# Altium footprint library LUMI_Standard_Auto_Soldering_LIB.PcbLib: 344 footprints (part 9 of 22)
Each footprint in its own frame and in the unit in brackets; x right, y up, seen from the top. Pads: shape width x height; smd on the part's side, far side on the other; paste and mask are expansions set on the pad; w line width, h text height; cw(c..) or ccw(c..) is an arc to the next point about the centre after c.
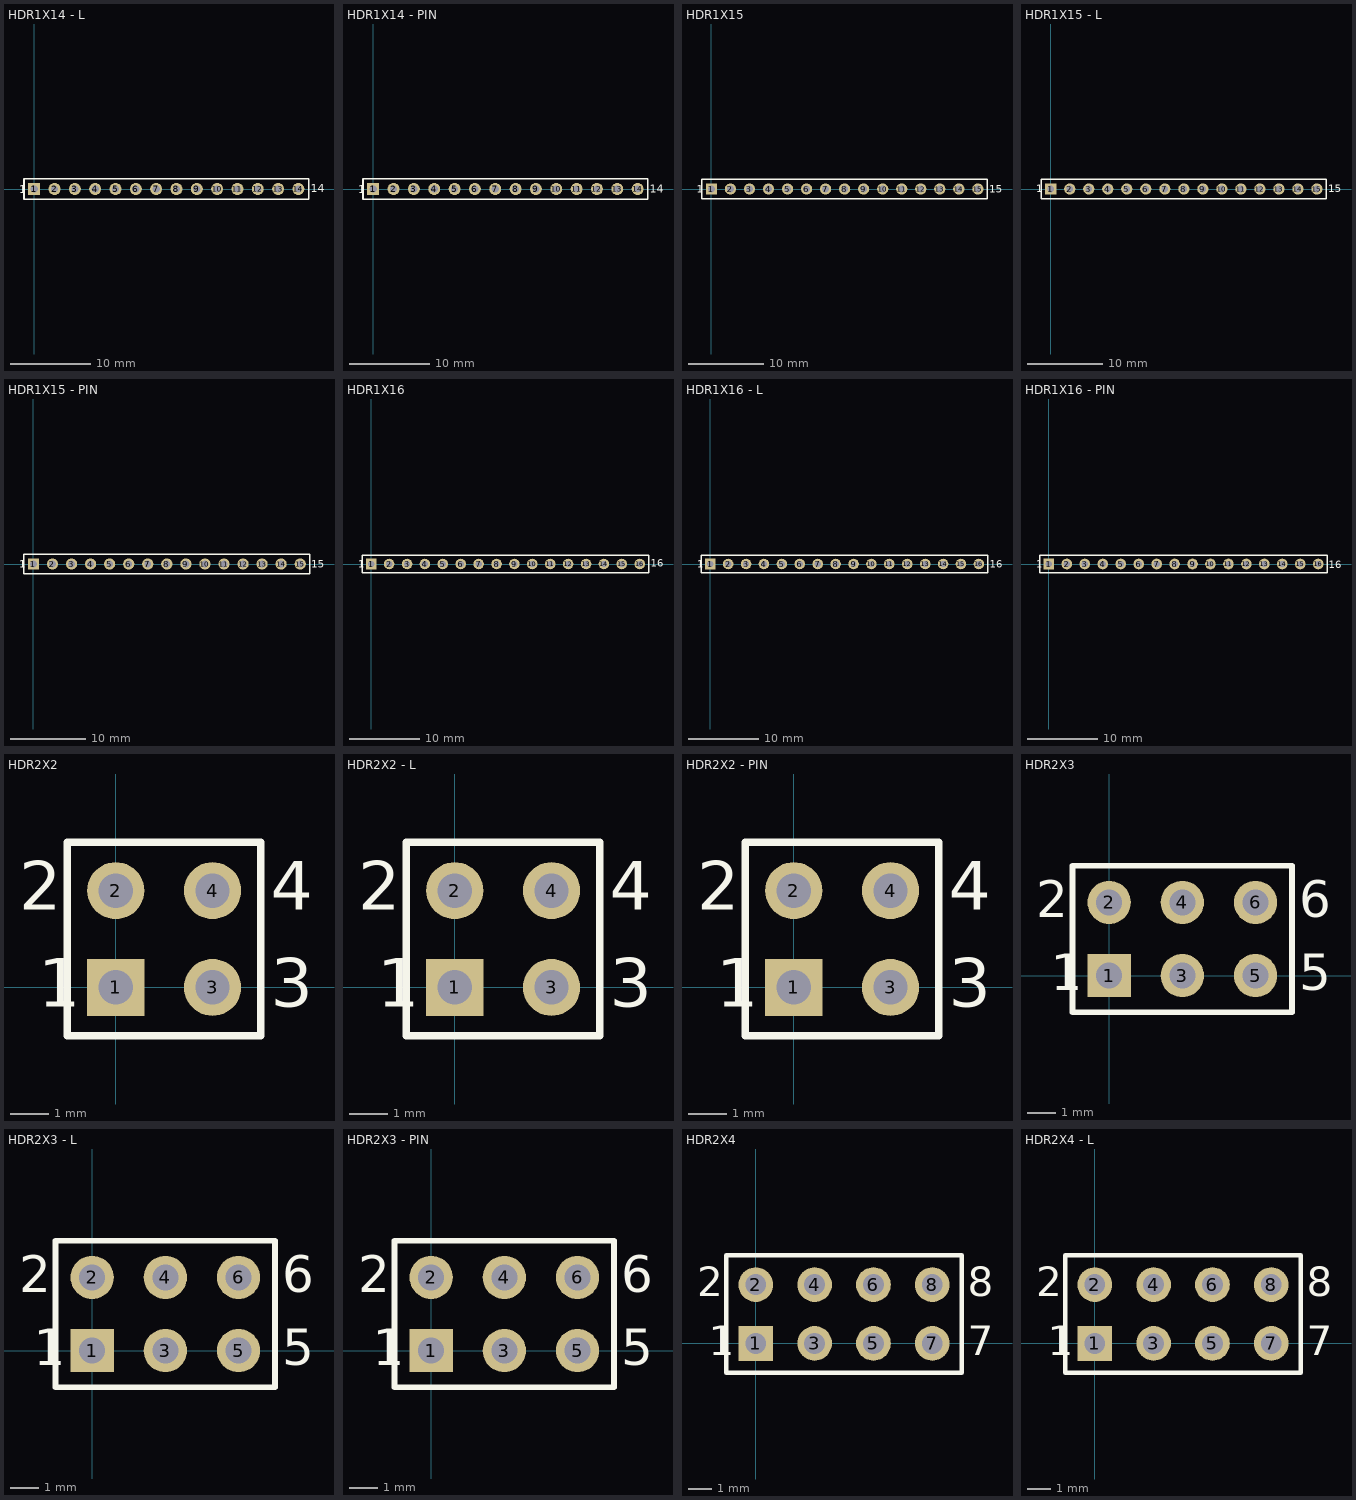
[diagram p8: the footprints below, top view; thin cyan lines are the x and y axes]

## HDR1X14 - L [mm] "Connector; Header; 14 Position"
pads (14):
  rect 1.5x1.5 hole 0.9: 1(0,0)
  round 1.5 hole 0.9: 2(2.54,0) 3(5.08,0) 4(7.62,0) 5(10.16,0) 6(12.7,0) 7(15.24,0) 8(17.78,0) 9(20.32,0) 10(22.86,0) 11(25.4,0) 12(27.94,0) 13(30.48,0) 14(33.02,0)
Top Overlay:
  lines w0.2: -1.27,-1.27 -1.27,1.27 0.635,1.27 34.29,1.27 34.29,-1.27 -1.27,-1.27
  text "14" at 34.575,-0.425 h1.02
  text "1" at -1.9,-0.525 h1.02
3D body: height 4.33, standoff -3, extent 16.586,-1.27 34.366,7
3D body: height 4.33, standoff -3, extent -1.219,-1.27 16.561,7

## HDR1X14 - PIN [mm] "Connector; Header; 14 Position"
pads (14):
  rect 1.5x1.5 hole 0.9: 1(0,0)
  round 1.5 hole 0.9: 2(2.54,0) 3(5.08,0) 4(7.62,0) 5(10.16,0) 6(12.7,0) 7(15.24,0) 8(17.78,0) 9(20.32,0) 10(22.86,0) 11(25.4,0) 12(27.94,0) 13(30.48,0) 14(33.02,0)
Top Overlay:
  lines w0.2: -1.27,-1.27 -1.27,1.27 0.635,1.27 34.29,1.27 34.29,-1.27 -1.27,-1.27
  text "1" at -1.9,-0.5 h1.02
  text "14" at 34.55,-0.45 h1.02
3D body: height 6.02, standoff -3.1, extent -1.27,-1.295 6.35,1.245
3D body: height 6.02, standoff -3.1, extent 6.35,-1.295 13.97,1.245
3D body: height 6.02, standoff -3.1, extent 13.97,-1.295 24.13,1.245
3D body: height 6.02, standoff -3.1, extent 24.13,-1.295 34.29,1.245

## HDR1X15 [mm] "Connector; Header; 15 Position"
pads (15):
  rect 1.5x1.5 hole 0.9: 1(0,0)
  round 1.5 hole 0.9: 2(2.54,0) 3(5.08,0) 4(7.62,0) 5(10.16,0) 6(12.7,0) 7(15.24,0) 8(17.78,0) 9(20.32,0) 10(22.86,0) 11(25.4,0) 12(27.94,0) 13(30.48,0) 14(33.02,0) 15(35.56,0)
Top Overlay:
  lines w0.2: -1.27,-1.27 -1.27,1.27 0.635,1.27 36.83,1.27 36.83,-1.27 -1.27,-1.27
  text "15" at 37.1,-0.475 h1.02
  text "1" at -1.925,-0.525 h1.02
3D body: height 8.52, standoff -2.48, extent -1.27,-1.25 11.43,1.25
3D body: height 8.52, standoff -2.48, extent 11.43,-1.25 24.13,1.25
3D body: height 8.52, standoff -2.48, extent 24.13,-1.25 36.83,1.25

## HDR1X15 - L [mm] "Connector; Header; 15 Position"
pads (15):
  rect 1.5x1.5 hole 0.9: 1(0,0)
  round 1.5 hole 0.9: 2(2.54,0) 3(5.08,0) 4(7.62,0) 5(10.16,0) 6(12.7,0) 7(15.24,0) 8(17.78,0) 9(20.32,0) 10(22.86,0) 11(25.4,0) 12(27.94,0) 13(30.48,0) 14(33.02,0) 15(35.56,0)
Top Overlay:
  lines w0.2: -1.27,-1.27 -1.27,1.27 0.635,1.27 36.83,1.27 36.83,-1.27 -1.27,-1.27
  text "1" at -1.975,-0.45 h1.02
  text "15" at 37.1,-0.45 h1.02
3D body: height 4.33, standoff -3, extent 24.13,-1.27 36.83,7
3D body: height 4.33, standoff -3, extent -1.295,-1.244 24.105,7.026

## HDR1X15 - PIN [mm] "Connector; Header; 15 Position"
pads (15):
  rect 1.5x1.5 hole 0.9: 1(0,0)
  round 1.5 hole 0.9: 2(2.54,0) 3(5.08,0) 4(7.62,0) 5(10.16,0) 6(12.7,0) 7(15.24,0) 8(17.78,0) 9(20.32,0) 10(22.86,0) 11(25.4,0) 12(27.94,0) 13(30.48,0) 14(33.02,0) 15(35.56,0)
Top Overlay:
  lines w0.2: -1.27,-1.27 36.83,-1.27 36.83,1.27 0.635,1.27 -1.27,1.27 -1.27,-1.27
  text "15" at 37.05,-0.475 h1.02
  text "1" at -1.925,-0.475 h1.02
3D body: height 6.02, standoff -3.1, extent -1.27,-1.295 8.89,1.245
3D body: height 6.02, standoff -3.1, extent 8.89,-1.295 19.05,1.245
3D body: height 6.02, standoff -3.1, extent 19.025,-1.295 29.185,1.245
3D body: height 6.02, standoff -3.1, extent 29.159,-1.295 36.779,1.245

## HDR1X16 [mm] "Connector; Header; 16 Position"
pads (16):
  rect 1.5x1.5 hole 0.9: 1(0,0)
  round 1.5 hole 0.9: 2(2.54,0) 3(5.08,0) 4(7.62,0) 5(10.16,0) 6(12.7,0) 7(15.24,0) 8(17.78,0) 9(20.32,0) 10(22.86,0) 11(25.4,0) 12(27.94,0) 13(30.48,0) 14(33.02,0) 15(35.56,0) 16(38.1,0)
Top Overlay:
  lines w0.2: -1.27,-1.27 39.37,-1.27 39.37,1.27 0.635,1.27 -1.27,1.27 -1.27,-1.27
  text "1" at -1.875,-0.5 h1.02
  text "16" at 39.675,-0.4 h1.02
3D body: height 8.55, standoff -2.43, extent 34.29,-1.27 39.37,1.27
3D body: height 8.55, standoff -2.43, extent 29.196,-1.289 34.276,1.251
3D body: height 8.55, standoff -2.43, extent 24.13,-1.295 29.21,1.245
3D body: height 8.55, standoff -2.43, extent 18.999,-1.295 24.079,1.245
3D body: height 8.55, standoff -2.43, extent 13.919,-1.295 18.999,1.245
3D body: height 8.55, standoff -2.43, extent 8.876,-1.289 13.956,1.251
3D body: height 8.55, standoff -2.43, extent 3.847,-1.289 8.927,1.251
3D body: height 8.55, standoff -2.43, extent -1.143,-1.295 3.937,1.245

## HDR1X16 - L [mm] "Connector; Header; 16 Position"
pads (16):
  rect 1.5x1.5 hole 0.9: 1(0,0)
  round 1.5 hole 0.9: 2(2.54,0) 3(5.08,0) 4(7.62,0) 5(10.16,0) 6(12.7,0) 7(15.24,0) 8(17.78,0) 9(20.32,0) 10(22.86,0) 11(25.4,0) 12(27.94,0) 13(30.48,0) 14(33.02,0) 15(35.56,0) 16(38.1,0)
Top Overlay:
  lines w0.2: -1.27,-1.27 39.37,-1.27 39.37,1.27 0.635,1.27 -1.27,1.27 -1.27,-1.27
  text "16" at 39.65,-0.5 h1.02
  text "1" at -1.875,-0.525 h1.02
3D body: height 4.33, standoff -3, extent -1.244,-1.244 13.996,7.026
3D body: height 4.33, standoff -3, extent 13.97,-1.245 39.37,7.025

## HDR1X16 - PIN [mm] "Connector; Header; 16 Position"
pads (16):
  rect 1.5x1.5 hole 0.9: 1(0,0)
  round 1.5 hole 0.9: 2(2.54,0) 3(5.08,0) 4(7.62,0) 5(10.16,0) 6(12.7,0) 7(15.24,0) 8(17.78,0) 9(20.32,0) 10(22.86,0) 11(25.4,0) 12(27.94,0) 13(30.48,0) 14(33.02,0) 15(35.56,0) 16(38.1,0)
Top Overlay:
  lines w0.2: -1.27,-1.27 -1.27,1.27 0.635,1.27 39.37,1.27 39.37,-1.27 -1.27,-1.27
  text "1" at -1.825,-0.525 h1.02
  text "16" at 39.6,-0.575 h1.02
3D body: height 6.02, standoff -3.1, extent -1.27,-1.27 8.89,1.27
3D body: height 6.02, standoff -3.1, extent 8.89,-1.27 19.05,1.27
3D body: height 6.02, standoff -3.1, extent 19.05,-1.27 29.21,1.27
3D body: height 6.02, standoff -3.1, extent 29.21,-1.27 39.37,1.27

## HDR2X2 [mm] "Connector; Header; 2x2 Position"
pads (4):
  rect 1.5x1.5 hole 0.9: 1(0,0)
  round 1.5 hole 0.9: 2(0,2.54) 3(2.54,0) 4(2.54,2.54)
Top Overlay:
  lines w0.2: -1.27,-1.27 3.81,-1.27 3.81,3.81 -1.27,3.81 -1.27,-1.27
  text "3" at 4.064,-0.508 h1.27
  text "4" at 4.064,2.032 h1.27
  text "2" at -2.54,2.032 h1.27
  text "1" at -2.032,-0.508 h1.27
3D body: height 8.4, standoff -3, extent -1.168,-1.306 3.912,3.694

## HDR2X2 - L [mm] "Connector; Header; 2x2 Position"
pads (4):
  rect 1.5x1.5 hole 0.9: 1(0,0)
  round 1.5 hole 0.9: 2(0,2.54) 3(2.54,0) 4(2.54,2.54)
Top Overlay:
  lines w0.2: -1.27,-1.27 -1.27,3.81 3.81,3.81 3.81,-1.27 -1.27,-1.27
  text "1" at -2.032,-0.508 h1.27
  text "2" at -2.54,2.032 h1.27
  text "4" at 4.064,2.032 h1.27
  text "3" at 4.064,-0.508 h1.27
3D body: height 3.2, standoff -5.08, extent 1.194,-9.396 3.734,3.023
3D body: height 3.2, standoff -5.08, extent -1.219,-9.422 1.321,2.997

## HDR2X2 - PIN [mm] "Connector; Header; 2x2 Position"
pads (4):
  rect 1.5x1.5 hole 0.9: 1(0,0)
  round 1.5 hole 0.9: 2(0,2.54) 3(2.54,0) 4(2.54,2.54)
Top Overlay:
  lines w0.2: -1.27,-1.27 3.81,-1.27 3.81,3.81 -1.27,3.81 -1.27,-1.27
  text "3" at 4.064,-0.508 h1.27
  text "4" at 4.064,2.032 h1.27
  text "2" at -2.54,2.032 h1.27
  text "1" at -2.032,-0.508 h1.27
3D body: height 6.02, standoff -3.1, extent 1.245,-1.27 3.785,3.81
3D body: height 6.02, standoff -3.1, extent -1.27,-1.27 1.27,3.81

## HDR2X3 [mm] "Connector; Header; 3x2 Position"
pads (6):
  rect 1.5x1.5 hole 0.9: 1(0,0)
  round 1.5 hole 0.9: 2(0,2.54) 3(2.54,0) 4(2.54,2.54) 5(5.08,0) 6(5.08,2.54)
Top Overlay:
  lines w0.2: 1.482,-1.27 6.35,-1.27 ; 6.35,-1.27 -1.27,-1.27 -1.27,3.81 6.35,3.81 6.35,-1.27
  text "1" at -2.032,-0.508 h1.27
  text "2" at -2.54,2.032 h1.27
  text "5" at 6.604,-0.508 h1.27
  text "6" at 6.604,2.032 h1.27
3D body: height 8.4, standoff -3, extent -1.219,-1.255 6.401,3.745

## HDR2X3 - L [mm] "Connector; Header; 3x2 Position"
pads (6):
  rect 1.5x1.5 hole 0.9: 1(0,0)
  round 1.5 hole 0.9: 2(0,2.54) 3(2.54,0) 4(2.54,2.54) 5(5.08,0) 6(5.08,2.54)
Top Overlay:
  lines w0.2: 1.482,-1.27 6.35,-1.27 ; 6.35,-1.27 6.35,3.81 -1.27,3.81 -1.27,-1.27 6.35,-1.27
  text "6" at 6.604,2.032 h1.27
  text "5" at 6.604,-0.508 h1.27
  text "2" at -2.54,2.032 h1.27
  text "1" at -2.032,-0.508 h1.27
3D body: height 3.2, standoff -5.08, extent 3.708,-9.384 6.248,3.034
3D body: height 3.2, standoff -5.08, extent 1.346,-9.41 3.886,3.009
3D body: height 3.2, standoff -5.08, extent -1.092,-9.384 1.448,3.034

## HDR2X3 - PIN [mm] "Connector; Header; 3x2 Position"
pads (6):
  rect 1.5x1.5 hole 0.9: 1(0,0)
  round 1.5 hole 0.9: 2(0,2.54) 3(2.54,0) 4(2.54,2.54) 5(5.08,0) 6(5.08,2.54)
Top Overlay:
  lines w0.2: 1.482,-1.27 6.35,-1.27 ; 6.35,-1.27 -1.27,-1.27 -1.27,3.81 6.35,3.81 6.35,-1.27
  text "1" at -2.032,-0.508 h1.27
  text "2" at -2.54,2.032 h1.27
  text "5" at 6.604,-0.508 h1.27
  text "6" at 6.604,2.032 h1.27
3D body: height 6.02, standoff -3.1, extent -1.295,-1.27 1.245,3.81
3D body: height 6.02, standoff -3.1, extent 1.194,-1.27 3.734,3.81
3D body: height 6.02, standoff -3.1, extent 3.734,-1.27 6.274,3.81

## HDR2X4 [mm] "Connector; Header; 4x2 Position"
pads (8):
  rect 1.5x1.5 hole 0.9: 1(0,0)
  round 1.5 hole 0.9: 2(0,2.54) 3(2.54,0) 4(2.54,2.54) 5(5.08,0) 6(5.08,2.54) 7(7.62,0) 8(7.62,2.54)
Top Overlay:
  lines w0.2: -1.27,-1.27 8.89,-1.27 8.89,3.81 -1.27,3.81 -1.27,-1.27
  text "2" at -2.54,2.032 h1.27
  text "1" at -2.032,-0.508 h1.27
  text "7" at 9.144,-0.508 h1.27
  text "8" at 9.144,2.032 h1.27
3D body: height 8.4, standoff -3, extent -1.194,-1.23 8.966,3.77

## HDR2X4 - L [mm] "Connector; Header; 4x2 Position"
pads (8):
  rect 1.5x1.5 hole 0.9: 1(0,0)
  round 1.5 hole 0.9: 2(0,2.54) 3(2.54,0) 4(2.54,2.54) 5(5.08,0) 6(5.08,2.54) 7(7.62,0) 8(7.62,2.54)
Top Overlay:
  lines w0.2: -1.27,-1.27 8.89,-1.27 8.89,3.81 -1.27,3.81 -1.27,-1.27
  text "2" at -2.54,2.032 h1.27
  text "1" at -2.032,-0.508 h1.27
  text "7" at 9.144,-0.508 h1.27
  text "8" at 9.144,2.032 h1.27
3D body: height 3.2, standoff -5.08, extent -1.092,-9.562 1.448,2.857
3D body: height 3.2, standoff -5.08, extent 1.448,-9.562 3.988,2.857
3D body: height 3.2, standoff -5.08, extent 3.886,-9.588 6.426,2.831
3D body: height 3.2, standoff -5.08, extent 6.35,-9.613 8.89,2.806